# Altium footprint library Pezo_imp.PCBLIB: 98 footprints (part 7 of 7)
Each footprint in its own frame and in the unit in brackets; x right, y up, seen from the top. Pads: shape width x height; smd on the part's side, far side on the other; paste and mask are expansions set on the pad; w line width, h text height; cw(c..) or ccw(c..) is an arc to the next point about the centre after c.
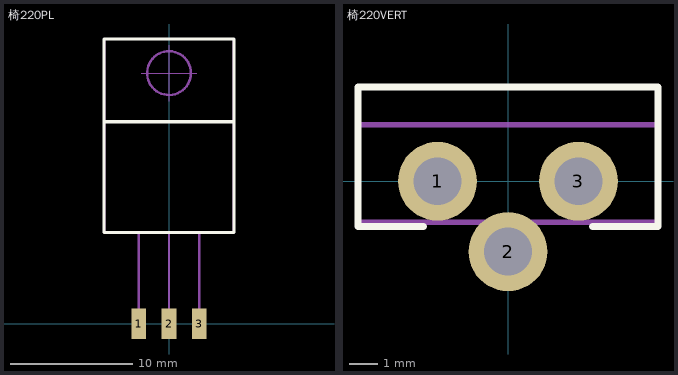
[diagram p6: the footprints below, top view; thin cyan lines are the x and y axes]

## 椅220PL [mm]
height 4.8
pads (3):
  rect 1.2x2.5 smd: 1(-2.5,0) 2(0,0) 3(2.5,0)
Top Overlay:
  lines w0.25: -5.325,16.6 5.325,16.6 ; -5.325,7.5 -5.325,23.4 5.325,23.4 5.325,7.5 -5.325,7.5
Mechanical 1:
  circle w0.2: c0,20.6 r1.8
  lines w0.1: -2.3,20.6 2.3,20.6 ; 0,18.3 0,22.9
  lines w0.2: -5.325,16.6 5.325,16.6 ; -2.5,-0.5 -2.5,7.5 ; 0,-0.5 0,7.5 ; 2.5,-0.5 2.5,7.5 ; -5.325,7.5 -5.325,23.4 5.325,23.4 5.325,7.5 -5.325,7.5
  text "2" at -0.46,8.248 h1.5
  text "3" at 2.847,8.248 h1.5
  text "1" at -3.635,8.248 h1.5
  text ".Designator" at -1.68,13.33 h1.5
3D body "椅220PL.STEP": height 4.8, standoff 0, extent -5.325,-0.52 5.325,23.38

## 椅220VERT [mm]
height 21
pads (3):
  round 2.8 hole 1.7: 1(-2.5,0) 2(0,-2.5) 3(2.5,0)
Top Overlay:
  lines w0.25: -3,-1.6 -5.325,-1.6 -5.325,3.35 5.325,3.35 5.325,-1.6 3,-1.6
Mechanical 1:
  lines w0.2: -5.325,2 5.325,2 ; 0,-2.5 0,-1.45 ; -5.325,-1.45 5.325,-1.45 5.325,3.35 -5.325,3.35 -5.325,-1.45
  text ".Designator" at -1.38,4.05 h1.5
  text "1" at -4.27,-0.017 h1.5
  text "3" at 3.482,-0.017 h1.5
  text "2" at -0.46,-0.682 h1.5
3D body "室-28_Vertical.STEP": height 21.6, standoff -3, extent -5.325,-3.05 5.325,3.35